# Altium integrated library AnalogDevices.IntLib: 130 symbols (part 1 of 4) (continued)
## AD9148BBPZ (continued)
part B pins: A1 AVSS (power) "Analog Supply Ground.", A2 AVSS (power) "Analog Supply Ground.", A5 AVSS (power) "Analog Supply Ground.", A7 VREF (power) "Band Gap Voltage Reference I/O. Decouple to analog ground via a 0.1 µF   capacitor. Output impedance is approximately 5 kΩ.", A8 I120 (power) "Tie to analog ground via a 10 kΩ resistor to generate a 120 µA reference current.", A10 AVSS (power) "Analog Supply Ground.", A13 AVSS (power) "Analog Supply Ground.", A14 AVSS (power) "Analog Supply Ground.", B1 AVSS (power) "Analog Supply Ground.", B2 AVSS (power) "Analog Supply Ground.", B5 AVSS (power) "Analog Supply Ground.", B7 NC hidden "Do not connect", B8 NC hidden "Do not connect", B10 AVSS (power) "Analog Supply Ground.", B13 AVSS (power) "Analog Supply Ground.", B14 AVSS (power) "Analog Supply Ground.", C3 AVSS (power) "Analog Supply Ground.", C4 AVSS (power) "Analog Supply Ground.", C5 AVSS (power) "Analog Supply Ground.", C6 AVSS (power) "Analog Supply Ground.", C7 AVSS (power) "Analog Supply Ground.", C8 AVSS (power) "Analog Supply Ground.", C9 AVSS (power) "Analog Supply Ground.", C10 AVSS (power) "Analog Supply Ground.", C11 AVSS (power) "Analog Supply Ground.", C12 AVSS (power) "Analog Supply Ground.", D3 AVSS (power) "Analog Supply Ground.", D4 AVSS (power) "Analog Supply Ground.", D5 AVSS (power) "Analog Supply Ground.", D6 AVSS (power) "Analog Supply Ground.", D7 AVSS (power) "Analog Supply Ground.", D8 AVSS (power) "Analog Supply Ground.", D9 AVSS (power) "Analog Supply Ground.", D10 AVSS (power) "Analog Supply Ground.", D11 AVSS (power) "Analog Supply Ground.", D12 AVSS (power) "Analog Supply Ground.", E1 AVSS (power) "Analog Supply Ground.", E2 AVSS (power) "Analog Supply Ground.", E3 AVSS (power) "Analog Supply Ground.", E4 AVSS (power) "Analog Supply Ground.", E5 AVSS (power) "Analog Supply Ground.", E6 CVDD18 (power) "1.8 V Clock Supply.", E7 CVDD18 (power) "1.8 V Clock Supply.", E8 CVDD18 (power) "1.8 V Clock Supply.", E9 CVDD18 (power) "1.8 V Clock Supply.", E10 AVSS (power) "Analog Supply Ground.", E11 AVSS (power) "Analog Supply Ground.", E12 AVSS (power) "Analog Supply Ground.", E13 AVSS (power) "Analog Supply Ground.", E14 AVSS (power) "Analog Supply Ground.", F1 AVSS (power) "Analog Supply Ground.", F2 AVSS (power) "Analog Supply Ground.", F3 AVSS (power) "Analog Supply Ground.", F4 AVSS (power) "Analog Supply Ground.", F5 AVDD33 (power) "3.3 V Analog Supply.", F6 AVDD33 (power) "3.3 V Analog Supply.", F7 AVDD33 (power) "3.3 V Analog Supply.", F8 AVDD33 (power) "3.3 V Analog Supply.", F9 AVDD33 (power) "3.3 V Analog Supply.", F10 AVDD33 (power) "3.3 V Analog Supply.", F11 AVSS (power) "Analog Supply Ground.", F12 AVSS (power) "Analog Supply Ground.", F13 AVSS (power) "Analog Supply Ground.", F14 AVSS (power) "Analog Supply Ground.", G3 IOVDD (power) "Supply for Serial Ports.", G4 IOVDD (power) "Supply for Serial Ports.", G5 DVSS (power) "Digital Supply Ground.", G6 DVSS (power) "Digital Supply Ground.", G7 DVSS (power) "Digital Supply Ground.", G8 DVSS (power) "Digital Supply Ground.", G9 DVSS (power) "Digital Supply Ground.", G10 DVSS (power) "Digital Supply Ground.", G11 TRENCH (power) "Connect this pin to VSS.", G12 TRENCH (power) "Connect this pin to VSS.", H5 DVSS (power) "Digital Supply Ground.", H6 DVSS (power) "Digital Supply Ground.", H7 DVSS (power) "Digital Supply Ground.", H8 DVSS (power) "Digital Supply Ground.", H9 DVSS (power) "Digital Supply Ground.", H10 DVSS (power) "Digital Supply Ground.", H11 NC hidden "Do not connect", J5 DVDD18 (power) "1.8 V Digital Supply.", J6 DVDD18 (power) "1.8 V Digital Supply.", J7 DVDD18 (power) "1.8 V Digital Supply.", J8 DVDD18 (power) "1.8 V Digital Supply.", J9 DVDD18 (power) "1.8 V Digital Supply.", J10 DVDD18 (power) "1.8 V Digital Supply.", K5 DVDD18 (power) "1.8 V Digital Supply.", K6 DVDD18 (power) "1.8 V Digital Supply.", K7 DVDD18 (power) "1.8 V Digital Supply.", K8 DVDD18 (power) "1.8 V Digital Supply.", K9 DVDD18 (power) "1.8 V Digital Supply.", K10 DVDD18 (power) "1.8 V Digital Supply."
part A text: DAC; AD9148
part B text: DAC; AD9148

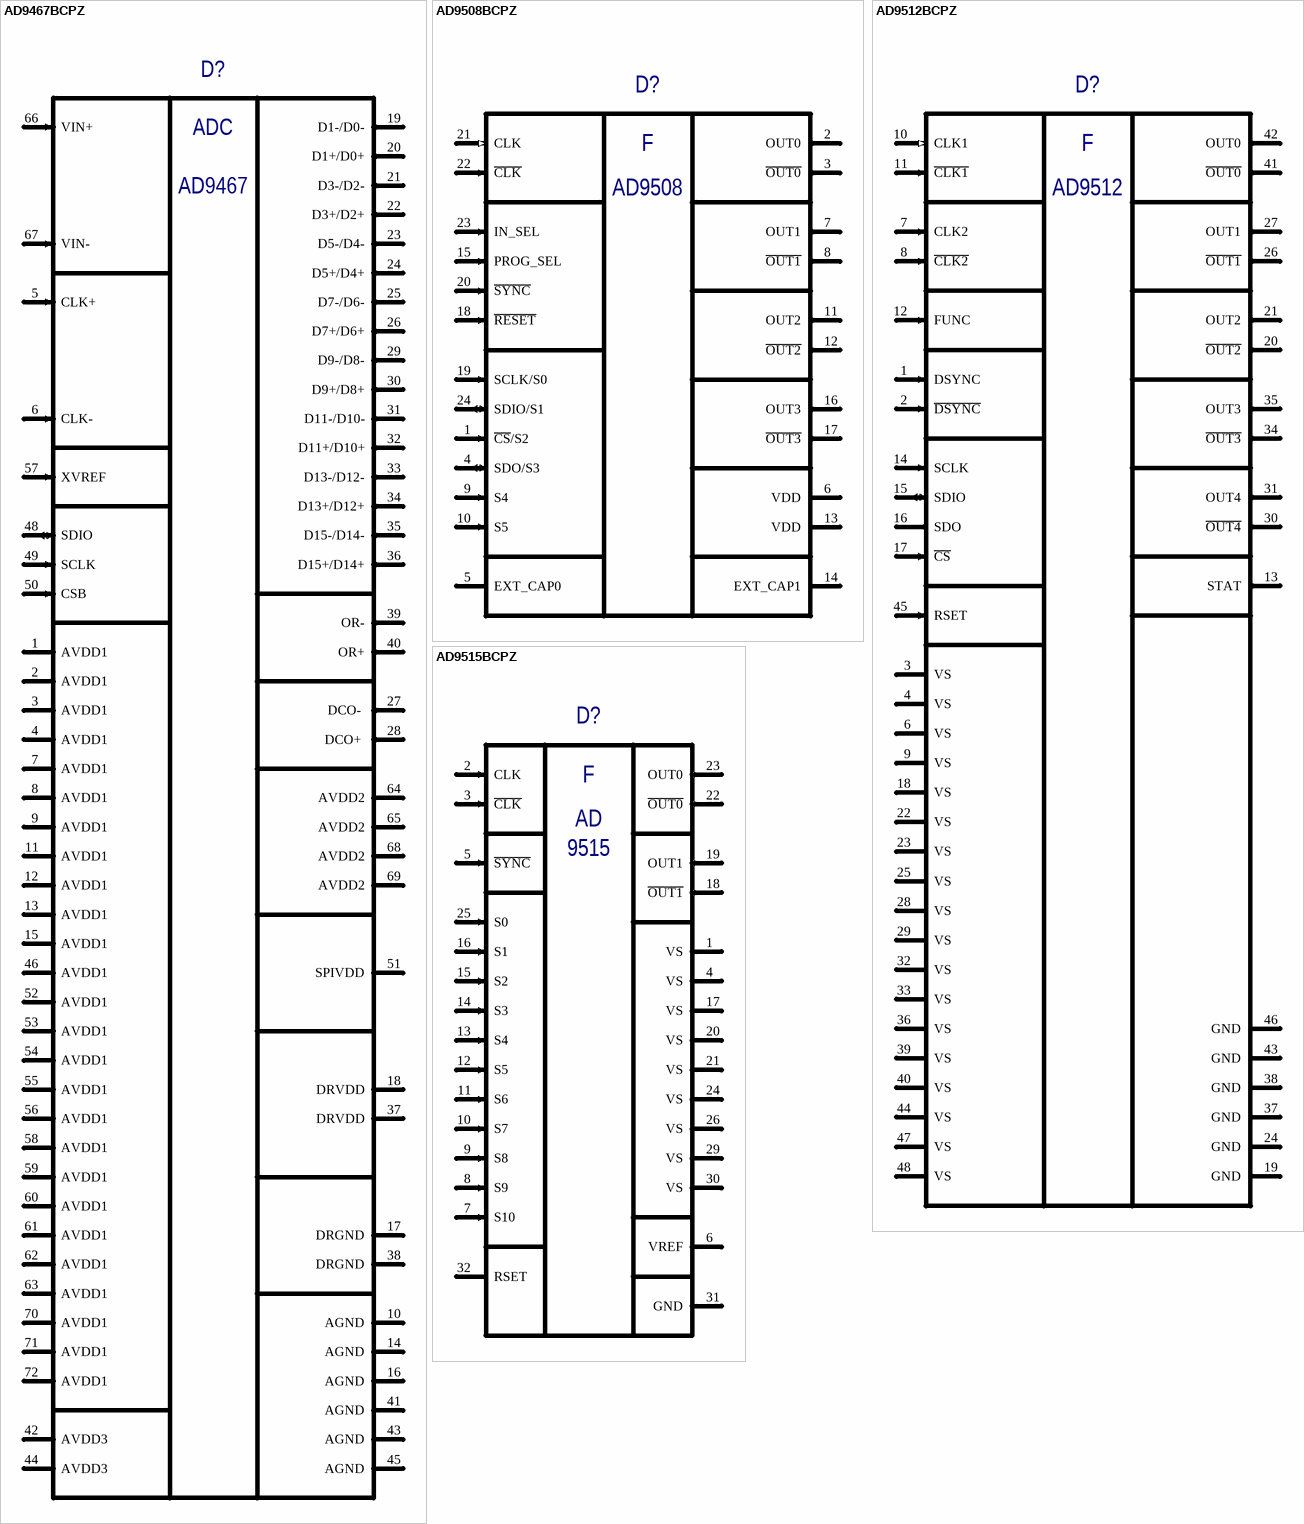
[diagram p3: symbols AD9467BCPZ to AD9515BCPZ]

## AD9467BCPZ
designator D?, comment AD9467BCPZ-250  (value not drawn)
16-Bit, 250 MSPS ADC; Manufacturer: Analog Devices; Type: Микросхема; BCPId: *; Name: *; Package: CP-72-5; ManufacturerPartNumber: AD9467BCPZ-250; HelpURL: *; Price: *; Rem: *; TU/GOST: *
footprint QFN50P1000X1000X90-72N (QFN, 72-Leads, Body 10,0x10,0mm (max), Pitch 0,50mm, IPC Medium Density)
footprint QFN50P1000X1000X90-72N-HS1 (QFN, 72-Leads, Body 10,0x10,0mm (max), Pitch 0,50mm, IPC Medium Density)
footprint QFN50P1000X1000X90-72N - HS2 (QFN, 72-Leads, Body 10,0x10,0mm (max), Pitch 0,50mm, IPC Medium Density)
pins: 1 AVDD1 (power) "1.8 V Analog Supply.", 2 AVDD1 (power) "1.8 V Analog Supply.", 3 AVDD1 (power) "1.8 V Analog Supply.", 4 AVDD1 (power) "1.8 V Analog Supply.", 5 CLK+  (in) "Clock Input True.", 6 CLK- (in) "Clock Input Complement.", 7 AVDD1 (power) "1.8 V Analog Supply.", 8 AVDD1 (power) "1.8 V Analog Supply.", 9 AVDD1 (power) "1.8 V Analog Supply.", 10 AGND (power) "Analog Ground.", 11 AVDD1 (power) "1.8 V Analog Supply.", 12 AVDD1 (power) "1.8 V Analog Supply.", 13 AVDD1 (power) "1.8 V Analog Supply.", 14 AGND (power) "Analog Ground.", 15 AVDD1 (power) "1.8 V Analog Supply.", 16 AGND (power) "Analog Ground.", 17 DRGND (power) "Digital Output Driver Ground.", 18 DRVDD (power) "1.8 V Digital Output Driver Supply.", 19 D1-/D0- (out) "D1 and D0 (LSB) Digital Output Complement.", 20 D1+/D0+ (out) "D1 and D0 (LSB) Digital Output True.", 21 D3-/D2- (out) "D3 and D2 Digital Output Complement.", 22 D3+/D2+ (out) "D3 and D2 Digital Output True.", 23 D5-/D4- (out) "D5 and D4 Digital Output Complement.", 24 D5+/D4+ (out) "D5 and D4 Digital Output True.", 25 D7-/D6- (out) "D7 and D6 Digital Output Complement.", 26 D7+/D6+ (out) "D7 and D6 Digital Output True.", 27 DCO-  (out) "Data Clock Digital Output Complement.", 28 DCO+  (out) "Data Clock Digital Output True.", 29 D9-/D8- (out) "D9 and D8 Digital Output Complement.", 30 D9+/D8+ (out) "D9 and D8 Digital Output True.", 31 D11-/D10- (out) "D11 and D10 Digital Output Complement.", 32 D11+/D10+ (out) "D11 and D10 Digital Output True.", 33 D13-/D12- (out) "D13 and D12 Digital Output Complement.", 34 D13+/D12+ (out) "D13 and D12 Digital Output True.", 35 D15-/D14- (out) "D15 (MSB) and D14 Digital Output Complement.", 36 D15+/D14+ (out) "D15 (MSB) and D14 Digital Output True.", 37 DRVDD (power) "1.8 V Digital Output Driver Supply.", 38 DRGND (power) "Digital Output Driver Ground.", 39 OR- (out) "Out-of-Range Digital Output Complement.", 40 OR+ (out) "Out-of-Range Digital Output True.", 41 AGND (power) "Analog Ground.", 42 AVDD3 (power) "1.8 V Analog Supply.", 43 AGND (power) "Analog Ground.", 44 AVDD3 (power) "1.8 V Analog Supply.", 45 AGND (power) "Analog Ground.", 46 AVDD1 (power) "1.8 V Analog Supply.", 48 SDIO  (io) "Serial Data Input/Output.", 49 SCLK  (in) "Serial Clock.", 50 CSB (in) "Chip Select Bar.", 51 SPIVDD (power) "1.8 V or 3.3 V SPI Supply", 52 AVDD1 (power) "1.8 V Analog Supply.", 53 AVDD1 (power) "1.8 V Analog Supply.", 54 AVDD1 (power) "1.8 V Analog Supply.", 55 AVDD1 (power) "1.8 V Analog Supply.", 56 AVDD1 (power) "1.8 V Analog Supply.", 57 XVREF (in) "External VREF Option.", 58 AVDD1 (power) "1.8 V Analog Supply.", 59 AVDD1 (power) "1.8 V Analog Supply.", 60 AVDD1 (power) "1.8 V Analog Supply.", 61 AVDD1 (power) "1.8 V Analog Supply.", 62 AVDD1 (power) "1.8 V Analog Supply.", 63 AVDD1 (power) "1.8 V Analog Supply.", 64 AVDD2 (power) "3.3 V Analog Supply.", 65 AVDD2 (power) "3.3 V Analog Supply.", 66 VIN+ (in) "Analog InputTrue", 67 VIN- (in) "Analog InputComplement", 68 AVDD2 (power) "3.3 V Analog Supply.", 69 AVDD2 (power) "3.3 V Analog Supply.", 70 AVDD1 (power) "1.8 V Analog Supply.", 71 AVDD1 (power) "1.8 V Analog Supply.", 72 AVDD1 (power) "1.8 V Analog Supply.", EPAD (power) hidden to GND "Exposed Paddle. The exposed paddle must be connected to AGND."
text: ADC; AD9467

## AD9508BCPZ
designator D?  (value not drawn)
1.65 GHz Clock Fanout Buffer with Output Dividers and Delay Adjust; Manufacturer: Analog Devices; Type: Микросхема; SymAuthor: Ерешко П.А.; BCPid: *; ManufacturerPartNumber: AD9508BCPZ; Package: CP-24-7
footprint QFN50P400X400X80_HS-25N (QFN, 24-Leads, Body 4,00x4,00mm, Pitch 0,50mm, Thermal Pad 2,75x2,75mm, IPC Medium Density)
pins: 1 ~{CS}/S2 (in) "Chip Select/Pin Programming. Multipurpose pin. This pin is controlled by the PROG_SEL pin", 2  OUT0 (out) "LVDS/HSTL Differential Output or Single-Ended CMOS Output", 3 ~{OUT0} (out) "Complementary LVDS/HSTL Differential Output or Single-Ended CMOS Output", 4 SDO/S3 (io) "Serial Data Output/Pin Programming. Multipurpose pin. This pin is controlled by the PROG_SEL pin.", 5 EXT_CAP0 "Tie this pin to a 0.47 μF capacitor to ground", 6 VDD "Power Supply (2.5 V or 3.3 V Operation)", 7 OUT1 (out) "LVDS/HSTL Differential Output or Single-Ended CMOS Output", 8 ~{OUT1} (out) "Complementary LVDS/HSTL Differential Output or Single-Ended CMOS Output", 9 S4 (in) "Pin Programming. Use this pin in pin programming mode only", 10 S5 (in) "Pin Programming. Use this pin in pin programming mode only", 11 OUT2 (out) "LVDS/HSTL Differential Output or Single-Ended CMOS Output", 12 ~{OUT2} (out) "Complementary LVDS/HSTL Differential Output or Single-Ended CMOS Output", 13 VDD (power) "Power Supply (2.5 V or 3.3 V Operation)", 14 EXT_CAP1 "Tie this pin to a 0.47 μF capacitor to ground", 15 PROG_SEL (in) "Three-State CMOS Input. Pin 15 selects the type of device programming interface", 16 OUT3 (out) "LVDS/HSTL Differential Output or Single-Ended CMOS Output", 17 ~{OUT3} (out) "Complementary LVDS/HSTL Differential Output or Single-Ended CMOS Output", 18 ~{RESET} (in) "Device Reset", 19 SCLK/S0 (in) "Serial Programming Clock. Multipurpose pin controlled by the PROG_SEL", 20 ~{SYNC}  (in) "Clock Synchronization", 21 CLK (in) "Differential Clock Input or Single-Ended CMOS Input", 22 ~{CLK} (in) "Complementary Differential Clock Input", 23 IN_SEL (in) "A logic high configures the CLK and ACLKEA inputs for a differential input signal. A logic low configures the input for single-ended CMOS applied to the CLK pin", 24 SDIO/S1 (io) "Serial Data I/O. Pin 24 is a multipurpose input controlled by the PROG_SEL", EPAD GND (power) hidden to GND "Exposed Pad. The exposed die pad must be connected to ground"
text: F; AD9508

## AD9512BCPZ
designator D?  (value not drawn)
1.2 GHz Clock Distribution IC, 1.6 GHz Inputs,Dividers,Delay Adjust, Five Outputs; Manufacturer: Analog Devices; Type: Микросхема; SymAuthor: Антонов М.С.; BCPid: *; ManufacturerPartNumber: AD9512BCPZ; TU/GOST: *; Price: *; Rem: *; Package: CP-48-1; Name: *
footprint QFN50P700X700X100-48N (QFN, 48-Leads, Body 7,0x7,0mm (max), Pitch 0,50mm, IPC Medium Density)
pins: 1  DSYNC  (in) "Detect Sync. Used for multichip synchronization.", 2  ~{DSYNC}  (in) "Detect Sync Complement. Used for multichip synchronization.", 3 VS  (power) "Power Supply (3.3 V).", 4 VS (power) "Power Supply (3.3 V).", 5 DNC (power) hidden "Do Not Connect.", 6 VS  (power) "Power Supply (3.3 V).", 7  CLK2  (in) "Clock Input.", 8  ~{CLK2} (in) "Complementary Clock Input. Used in conjunction with CLK2.", 9 VS (power) "Power Supply (3.3 V).", 10  CLK1  (in) "Clock Input.", 11  ~{CLK1}  (in) "Complementary Clock Input. Used in conjunction with CLK1.", 12  FUNC (in) "Multipurpose Input. Can be programmed as a reset (RESETB), sync (SYNCB), or power-down (PDB) pin.", 13  STAT (out) "Output Used to Monitor the Status of Multichip Synchronization.", 14  SCLK  (in) "Serial Data Clock.", 15  SDIO  (io) "Serial Data I/O.", 16  SDO  (out) "Serial Data Output.", 17  ~{CS} (in) "Serial Port Chip Select.", 18 VS  (power) "Power Supply (3.3 V).", 19 GND (power) "Ground.", 20 ~{OUT2} (out) "Complementary LVPECL Output.", 21  OUT2 (out) "LVPECL Output.", 22 VS (power) "Power Supply (3.3 V).", 23 VS  (power) "Power Supply (3.3 V).", 24 GND (power) "Ground.", 25 VS (power) "Power Supply (3.3 V).", 26  ~{OUT1} (out) "Complementary LVPECL Output.", 27  OUT1 (out) "LVPECL Output.", 28 VS  (power) "Power Supply (3.3 V).", 29 VS (power) "Power Supply (3.3 V).", 30  ~{OUT4} (out) "Complementary LVDS/Inverted CMOS Output. OUT4 includes a delay block.", 31  OUT4 (out) "LVDS/CMOS Output. OUT4 includes a delay block.", 32 VS  (power) "Power Supply (3.3 V).", 33 VS (power) "Power Supply (3.3 V).", 34  ~{OUT3} (out) "Complementary LVDS/Inverted CMOS Output.", 35  OUT3 (out) "LVDS/CMOS Output.", 36 VS  (power) "Power Supply (3.3 V).", 37 GND (power) "Ground.", 38 GND (power) "Ground.", 39 VS (power) "Power Supply (3.3 V).", 40 VS  (power) "Power Supply (3.3 V).", 41  ~{OUT0} (out) "Complementary LVPECL Output.", 42  OUT0 (out) "LVPECL Output.", 43 GND (power) "Ground.", 44 VS (power) "Power Supply (3.3 V).", 45  RSET  (in) "Current Set Resistor to Ground. Nominal value = 4.12 kΩ.", 46 GND (power) "Ground.", 47 VS  (power) "Power Supply (3.3 V).", 48 VS (power) "Power Supply (3.3 V).", EPAD GND hidden to GND
text: F; AD9512

## AD9515BCPZ
designator D?  (value not drawn)
1.6 GHz Clock Distribution IC, Dividers, Delay Adjust, Two Outputs; Manufacturer: Analog Devices; Type: Микросхема; BCPId: *; Name: *; Package: CP-32-2; ManufacturerPartNumber: AD9515BCPZ; HelpURL: *; Price: *; Rem: *; TU/GOST: *
footprint QFN50P500X500X100-32N+325x325 (QFN, 32-Leads, Body 5,0x5,0mm (max), Pitch 0,50mm, IPC Medium Density with thermal tab 3.25x3.25)
pins: 1 VS (power) "Power Supply (3.3 V)", 2 CLK (in) "Clock Input", 3 ~{CLK} (in) "Complementary Clock Input. Used in conjunction with CLK", 4 VS (power) "Power Supply (3.3 V)", 5 ~{SYNC} (in) "Used to Synchronize the Outputs; Active Low Signal", 6 VREF "Provides 2/3 VSReference Voltage for Use with Programming Pins S0 to S10", 7 S10 (in) "Programming Pin", 8 S9 (in) "Programming Pin", 9 S8 (in) "Programming Pin", 10 S7 (in) "Programming Pin", 11 S6 (in) "Programming Pin", 12 S5 (in) "Programming Pin", 13 S4 (in) "Programming Pin", 14 S3 (in) "Programming Pin", 15 S2 (in) "Programming Pin", 16 S1 (in) "Programming Pin", 17 VS (power) "Power Supply (3.3 V)", 18 ~{OUT1} (out) "Complementary LVDS/Inverted CMOS Output. Includes a delay block", 19 OUT1 (out) "LVDS/CMOS Output. Includes a delay block", 20 VS (power) "Power Supply (3.3 V)", 21 VS (power) "Power Supply (3.3 V)", 22 ~{OUT0} (out) "Complementary LVPECL Output", 23 OUT0 (out) "LVPECL Output", 24 VS (power) "Power Supply (3.3 V)", 25 S0 (in) "Programming Pin", 26 VS (power) "Power Supply (3.3 V)", 29 VS (power) "Power Supply (3.3 V)", 30 VS (power) "Power Supply (3.3 V)", 31 GND "Ground. The exposed paddle on the back of the chip is also GND", 32 RSET "Current Sets Resistor to Ground. Nominal value = 4.12 kΩ", EPAD GND (power) hidden to GND "Ground. The exposed paddle on the back of the chip is also GND"
text: F; AD; 9515

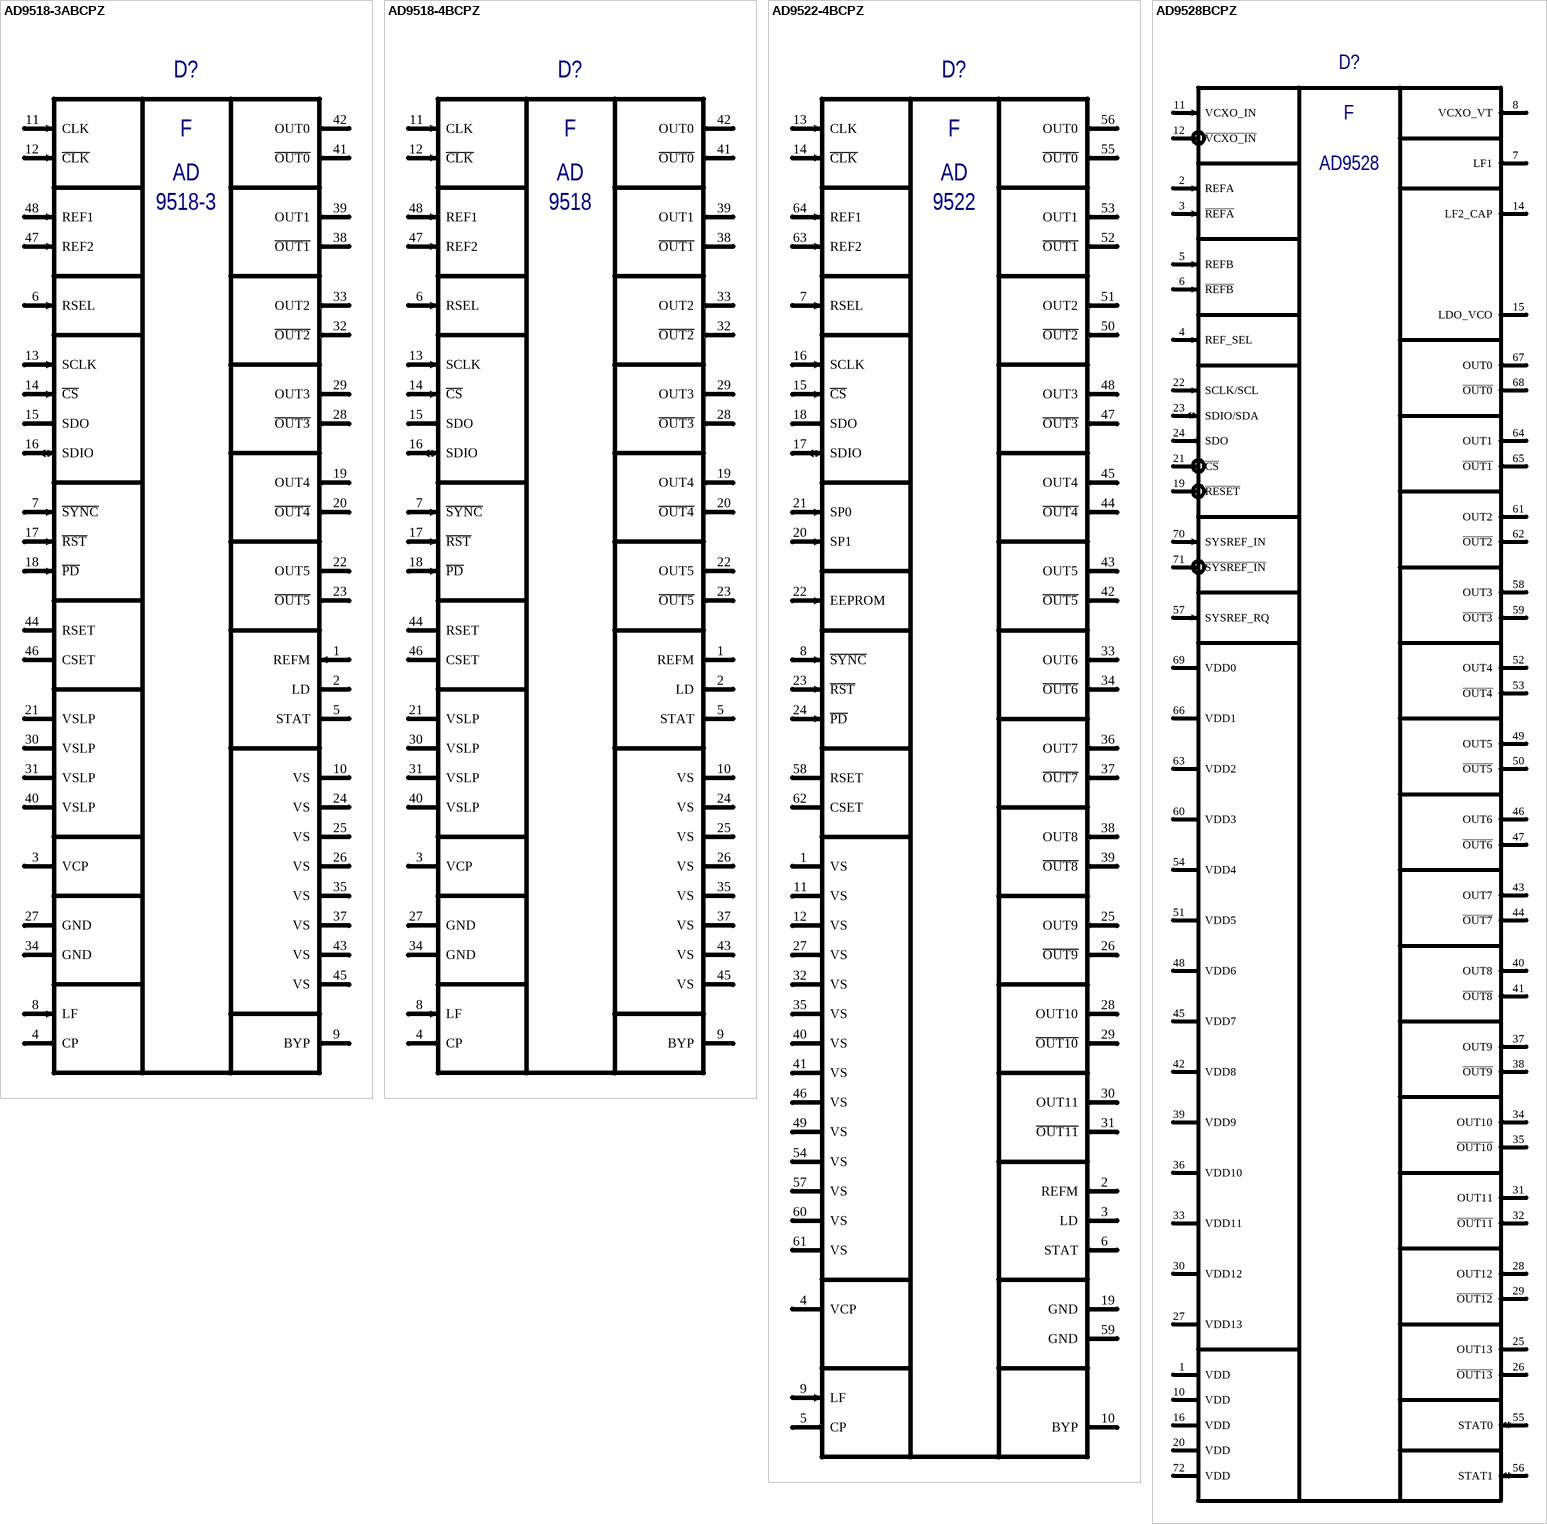
[diagram p4: symbols AD9518-3ABCPZ to AD9528BCPZ]

## AD9518-3ABCPZ
designator D?  (value not drawn)
6-Output Clock Generator with Integrated 2.0 GHz VCO; Manufacturer: Analog Devices; Type: Микросхема; SymAuthor: Семенов В.С.; BCPId: *; Name: *; Package: CP-48-8; ManufacturerPartNumber: AD9518-3ABCPZ; HelpURL: *; Price: *; Rem: *; TU/GOST: *
footprint QFN50P700X700X100_HS-49N (QFN, 48-Leads, Body 7,00x7,00mm, Pitch 0,50mm, Thermal Pad 5,50x5,50mm, IPC Medium Density)
pins: 1 REFM (in) "Reference Monitor", 2 LD (out) "Lock Detect", 3 VCP (power) "Power Supply for Charge Pump", 4 CP (out) "Charge Pump (Output). Connects to external loop filter.", 5 STAT (out) "Status", 6 RSEL (in) "Reference Select", 7 ~{SYNC} (in) "Manual Synchronizations and Manual Holdover", 8 LF (in) "Loop Filter", 9 BYP (out) "Loop Filter", 10 VS (power) "3.3 V Power Pin", 11 CLK (in) "Input for the clock distribution section", 12 ~{CLK} (in) "Inverse input for the clock distribution section", 13 SCLK (in) "Serial Control Port Data Clock Signal", 14 ~{CS} (in) "Serial Control Port Chip Select", 15 SDO (out) "Serial Control Port Unidirectional Serial Data Out", 16 SDIO (io) "Serial Control Port Bidirectional Serial Data In/Out", 17 ~{RST} (in) "Chip Reset", 18 ~{PD} (in) "Chip Power Down", 19 OUT4 (out) "LVPECL Output", 20 ~{OUT4} (out) "LVPECL Output", 21 VSLP (power) "Extended Voltage 2.5 V to 3.3 V LVPECL Power Pin", 22 OUT5 (out) "LVPECL Output", 23 ~{OUT5} (out) "LVPECL Output", 24 VS (power) "3.3 V Power Pin", 25 VS (power) "3.3 V Power Pin", 26 VS (power) "3.3 V Power Pin", 27 GND (power) "Ground.See the description for EPAD", 28 ~{OUT3} (out) "LVPECL Output", 29 OUT3 (out) "LVPECL Output", 30 VSLP (power) "Extended Voltage 2.5 V to 3.3 V LVPECL Power Pin", 31 VSLP (power) "Extended Voltage 2.5 V to 3.3 V LVPECL Power Pin", 32 ~{OUT2} (out) "LVPECL Output", 33 OUT2 (out) "LVPECL Output", 34 GND (power) "Ground.See the description for EPAD", 35 VS (power) "3.3 V Power Pin", 36 NC hidden, 37 VS (power) "3.3 V Power Pin", 38 ~{OUT1} (out) "LVPECL Output", 39 OUT1 (out) "LVPECL Output", 40 VSLP (power) "Extended Voltage 2.5 V to 3.3 V LVPECL Power Pin", 41 ~{OUT0} (out) "LVPECL Output", 42 OUT0 (out) "LVPECL Output", 43 VS (power) "3.3 V Power Pin", 44 RSET "Resistor connected here sets internal bias currents", 45 VS (power) "3.3 V Power Pin", 46 CSET "Resistor connected here sets the CP current range", 47 REF2 (in) "PLL reference", 48 REF1 (in) "PLL reference", EPAD GND (power) hidden to GND "Ground"
text: F; AD; 9518-3

## AD9518-4BCPZ
designator D?  (value not drawn)
6-Output Clock Generator with Integrated 1.6 GHz VCO; Manufacturer: Analog Devices; Type: Микросхема; BCPId: *; Name: *; Package: CP-48-8; ManufacturerPartNumber: AD9518-4BCPZ; HelpURL: *; Price: *; Rem: *; TU/GOST: *
footprint QFN50P700X700X100_HS-49N (QFN, 48-Leads, Body 7,00x7,00mm, Pitch 0,50mm, Thermal Pad 5,50x5,50mm, IPC Medium Density)
pins: 1 REFM (out) "Reference Monitor", 2 LD (out) "Lock Detect", 3 VCP (power) "Power Supply for Charge Pump", 4 CP (out) "Charge Pump (Output). Connects to external loop filter.", 5 STAT (out) "Status", 6 RSEL (in) "Reference Select", 7 ~{SYNC} (in) "Manual Synchronizations and Manual Holdover", 8 LF (in) "Loop Filter", 9 BYP "Loop Filter", 10 VS (power) "3.3 V Power Pin", 11 CLK (in) "Input for the clock distribution section", 12 ~{CLK} (in) "Inverse input for the clock distribution section", 13 SCLK (in) "Serial Control Port Data Clock Signal", 14 ~{CS} (in) "Serial Control Port Chip Select", 15 SDO (out) "Serial Control Port Unidirectional Serial Data Out", 16 SDIO (io) "Serial Control Port Bidirectional Serial Data In/Out", 17 ~{RST} (in) "Chip Reset", 18 ~{PD} (in) "Chip Power Down", 19 OUT4 (out) "LVPECL Output", 20 ~{OUT4} (out) "LVPECL Output", 21 VSLP (power) "Extended Voltage 2.5 V to 3.3 V LVPECL Power Pin", 22 OUT5 (out) "LVPECL Output", 23 ~{OUT5} (out) "LVPECL Output", 24 VS (power) "3.3 V Power Pin", 25 VS (power) "3.3 V Power Pin", 26 VS (power) "3.3 V Power Pin", 27 GND "Ground.See the description for EPAD", 28 ~{OUT3} (out) "LVPECL Output", 29 OUT3 (out) "LVPECL Output", 30 VSLP (power) "Extended Voltage 2.5 V to 3.3 V LVPECL Power Pin", 31 VSLP (power) "Extended Voltage 2.5 V to 3.3 V LVPECL Power Pin", 32 ~{OUT2} (out) "LVPECL Output", 33 OUT2 (out) "LVPECL Output", 34 GND "Ground.See the description for EPAD", 35 VS (power) "3.3 V Power Pin", 37 VS (power) "3.3 V Power Pin", 38 ~{OUT1} (out) "LVPECL Output", 39 OUT1 (out) "LVPECL Output", 40 VSLP (power) "Extended Voltage 2.5 V to 3.3 V LVPECL Power Pin", 41 ~{OUT0} (out) "LVPECL Output", 42 OUT0 (out) "LVPECL Output", 43 VS (power) "3.3 V Power Pin", 44 RSET "Resistor connected here sets internal bias currents", 45 VS (power) "3.3 V Power Pin", 46 CSET "Resistor connected here sets the CP current range", 47 REF2 (in) "PLL reference", 48 REF1 (in) "PLL reference", EPAD GND (power) hidden to GND "Ground"
text: F; AD; 9518

## AD9522-4BCPZ
designator D?  (value not drawn)
12 LVDS/24 CMOS Output Clock Generator with Integrated 1.6 GHz VCO; Manufacturer: Analog Devices; Type: Микросхема; BCPId: *; Name: *; Package: CP-64-4; ManufacturerPartNumber: AD9522-4BCPZ; HelpURL: *; Price: *; Rem: *; TU/GOST: *
footprint QFN50P900X900X100-65N (QFN, 64-Leads, Body 9,0x9,0mm (max), Pitch 0,50mm, IPC Medium Density)
footprint QFN50P900X900X100-65N - HS1 (QFN, 64-Leads, Body 9,0x9,0mm (max), Pitch 0,50mm, IPC Medium Density)
pins: 1 VS             (power) "3.3 V Power Pin", 2 REFM (out) "Reference Monitor", 3 LD (out) "Lock Detect", 4 VCP (power) "Power Supply for Charge Pump VS < VCP < 5.0 V. VCP must still be connected to 3.3 V if the PLL is not used.", 5 CP (out) "Charge Pump", 6 STAT (out) "Programmable Status Output", 7 RSEL (in) "Reference Select", 8 ~{SYNC} (in) "Manual Synchronizations and Manual Holdover", 9 LF (in) "Loop Filter", 10 BYP (power) "This pin is for bypassing the LDO to ground with a 220 nF capacitor", 11 VS (power) "3.3 V Power Pin", 12 VS (power) "3.3 V Power Pin", 13 CLK (in) "Differential input for the clock distribution section", 14 ~{CLK} (in) "Differential input for the clock distribution section", 15 ~{CS} (in) "Serial Control Port Chip Select", 16 SCLK (in) "Serial Control Port Clock Signal", 17 SDIO (io) "Serial Control Port Bidirectional Serial Data In/Out", 18 SDO (out) "Serial Control Port Unidirectional Serial Data Out", 19 GND (power) "Ground Pin", 20 SP1 (in) "Select SPI or I2C as the serial interface port and select the I2C slave address in I2C mode", 21 SP0 (in) "Select SPI or I2C as the serial interface port and select the I2C slave address in I2C mode", 22 EEPROM (in) "Setting this pin high selects the register values stored in the internal EEPROM to be loaded at reset and/or power-up", 23 ~{RST} (in) "Chip Reset. Active Low", 24 ~{PD} (in) "Chip Power-Down. Active Low", 25 OUT9 (out) "Differential LVDS or single-ended CMOS output", 26 ~{OUT9} (out) "Differential LVDS or single-ended CMOS output", 27 VS (power) "3.3 V Power Pin", 28 OUT10 (out) "Differential LVDS or single-ended CMOS output", 29 ~{OUT10} (out) "Differential LVDS or single-ended CMOS output", 30 OUT11 (out) "Differential LVDS or single-ended CMOS output", 31 ~{OUT11} (out) "Differential LVDS or single-ended CMOS output", 32 VS (power) "3.3 V Power Pin", 33 OUT6 (out) "Differential LVDS or single-ended CMOS output", 34 ~{OUT6} (out) "Differential LVDS or single-ended CMOS output", 35 VS (power) "3.3 V Power Pin", 36 OUT7 (out) "Differential LVDS or single-ended CMOS output", 37 ~{OUT7} (out) "Differential LVDS or single-ended CMOS output", 38 OUT8 (out) "Differential LVDS or single-ended CMOS output", 39 ~{OUT8} (out) "Differential LVDS or single-ended CMOS output", 40 VS (power) "3.3 V Power Pin", 41 VS (power) "3.3 V Power Pin", 42 ~{OUT5} (out) "Differential LVDS or single-ended CMOS output", 43 OUT5 (out) "Differential LVDS or single-ended CMOS output", 44 ~{OUT4} (out) "Differential LVDS or single-ended CMOS output", 45 OUT4 (out) "Differential LVDS or single-ended CMOS output", 46 VS (power) "3.3 V Power Pin", 47 ~{OUT3} (out) "Differential LVDS or single-ended CMOS output", 48 OUT3 (out) "Differential LVDS or single-ended CMOS output", 49 VS (power) "3.3 V Power Pin", 50 ~{OUT2} (out) "Differential LVDS or single-ended CMOS output", 51 OUT2 (out) "Differential LVDS or single-ended CMOS output", 52 ~{OUT1} (out) "Differential LVDS or single-ended CMOS output", 53 OUT1 (out) "Differential LVDS or single-ended CMOS output", 54 VS (power) "3.3 V Power Pin", 55 ~{OUT0} (out) "Differential LVDS or single-ended CMOS output", 56 OUT0 (out) "Differential LVDS or single-ended CMOS output", 57 VS (power) "3.3 V Power Pin", 58 RSET "Clock Distribution Current Set Resistor. Connect a 4.12 kOhm resistor from this pin to GND.", 59 GND (power) "Ground Pin", 60 VS (power) "3.3 V Power Pin", 61 VS (power) "3.3 V Power Pin", 62 CSET "Charge Pump Current Set Resistor. Connect a 5.1 kOhm resistor from this pin to GND", 63 REF2 (in) "Differential input for the PLL reference", 64 REF1 (in) "Differential input for the PLL reference", EPAD GND (power) hidden to GND "The exposed die pad must be connected to GND"
text: F; AD; 9522